# Altium footprint library IntegratedPcbLib.PcbLib: 81 footprints (part 3 of 6)
Each footprint in its own frame and in the unit in brackets; x right, y up, seen from the top. Pads: shape width x height; smd on the part's side, far side on the other; paste and mask are expansions set on the pad; w line width, h text height; cw(c..) or ccw(c..) is an arc to the next point about the centre after c.
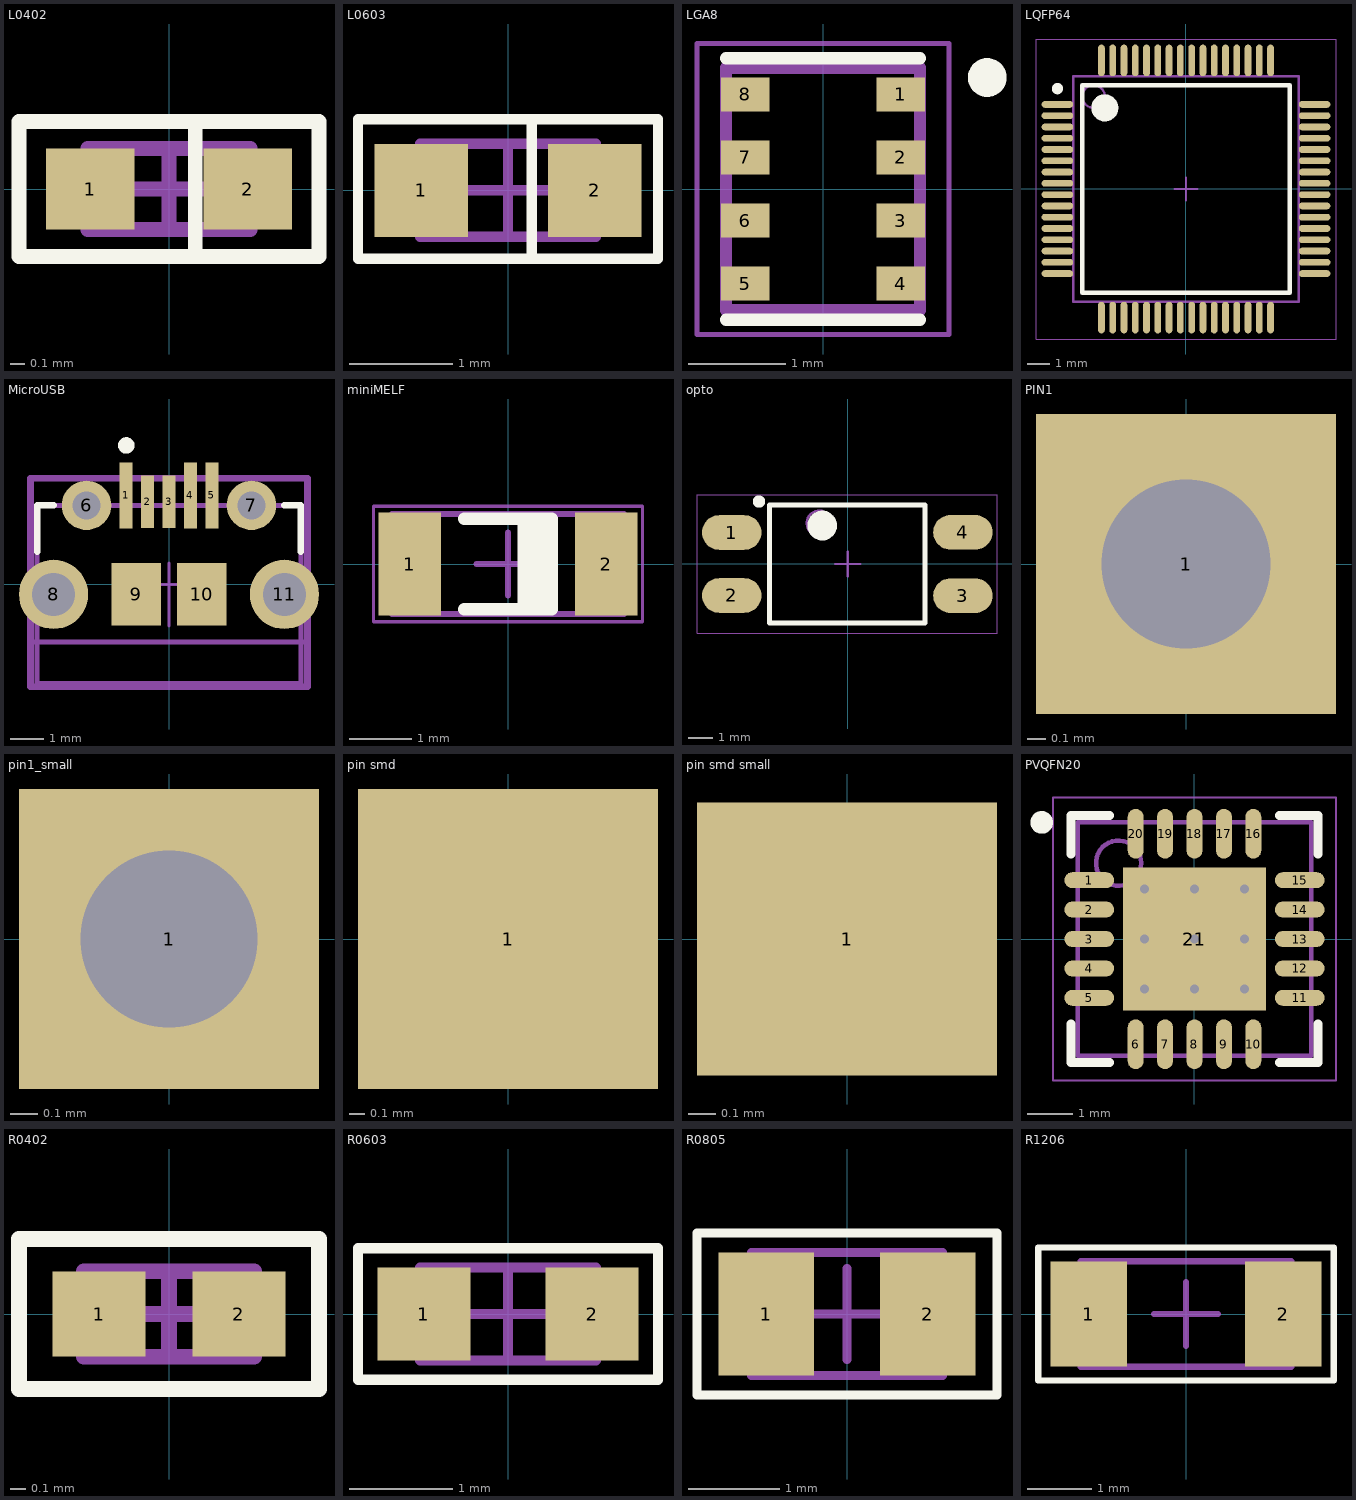
[diagram p2: the footprints below, top view; thin cyan lines are the x and y axes]

## L0402 [mm] "Chip LED, 2-Leads, Body 1,00x0,50mm, IPC Medium Density"
height 0.4
pads (2):
  rect 0.6x0.55 smd: 1(-0.533,0) 2(0.533,0)
Top Overlay:
  lines w0.1: 0.178,-0.432 0.178,0.432 ; -1.016,-0.457 -1.016,0.457 1.016,0.457 1.016,-0.457 -1.016,-0.457
Mechanical 13:
  lines w0.1: -0.55,-0.275 -0.55,0.275 0.55,0.275 0.55,-0.275 -0.55,-0.275
Mechanical 15:
  lines w0.1: -0.275,0 0.275,0 ; 0,-0.275 0,0.275
3D body "User Library-LED SMD0603.step": height 0.68, standoff 0, extent -0.825,-0.35 0.825,0.375

## L0603 [mm] "Chip LED, 2-Leads, Body 1,60x0,80mm, IPC Medium Density"
height 0.5
pads (2):
  rect 0.9x0.9 smd: 1(-0.838,0) 2(0.838,0)
Top Overlay:
  lines w0.1: 0.229,-0.635 0.229,0.635 ; -1.45,-0.66 1.45,-0.66 1.45,0.686 -1.45,0.686 -1.45,-0.66
Mechanical 13:
  lines w0.1: -0.85,-0.45 0.85,-0.45 0.85,0.45 -0.85,0.45 -0.85,-0.45
Mechanical 15:
  lines w0.1: -0.45,0 0.45,0 ; 0,-0.45 0,0.45
3D body "User Library-LED SMD0603.step": height 0.68, standoff 0, extent -0.825,-0.35 0.825,0.375

## LGA8 [mm]
pads (8):
  rect 0.5x0.35 smd: 1(0.8,0.975) 2(0.8,0.325) 3(0.8,-0.325) 4(0.8,-0.975) 5(-0.8,-0.975) 6(-0.8,-0.325) 7(-0.8,0.325) 8(-0.8,0.975)
Top Overlay:
  circle w0.2: c1.695,1.15 r0.1
  lines w0.127: -1,-1.35 1,-1.35 ; -1,1.35 1,1.35
Mechanical 4:
  lines w0.127: -1,-1.25 1,-1.25 ; -1,-1.25 -1,1.25 ; -1,-1.25 1,-1.25 ; -1,-1.25 -1,1.25 ; -1,1.25 1,1.25 ; -1,1.25 1,1.25 ; 1,-1.25 1,1.25 ; 1,-1.25 1,1.25
Mechanical 16:
  lines w0.05: -1.3,-1.5 -1.3,1.5 1.3,1.5 1.3,-1.5 -1.3,-1.5
3D body "User Library-BST-BMP280.step": height 1, standoff 0, extent -1,-1.25 1,1.25

## LQFP64 [mm] "LQFP, 64-Leads, Body 10,00x10,00mm, Pitch 0,50mm, IPC Medium Density"
height 1.6
pads (64):
  oval 1.4x0.3 smd: 1(-5.7,3.75) 2(-5.7,3.25) 3(-5.7,2.75) 4(-5.7,2.25) 5(-5.7,1.75) 6(-5.7,1.25) 7(-5.7,0.75) 8(-5.7,0.25) 9(-5.7,-0.25) 10(-5.7,-0.75) 11(-5.7,-1.25) 12(-5.7,-1.75) 13(-5.7,-2.25) 14(-5.7,-2.75) 15(-5.7,-3.25) 16(-5.7,-3.75) 33(5.7,-3.75) 34(5.7,-3.25) 35(5.7,-2.75) 36(5.7,-2.25) 37(5.7,-1.75) 38(5.7,-1.25) 39(5.7,-0.75) 40(5.7,-0.25) 41(5.7,0.25) 42(5.7,0.75) 43(5.7,1.25) 44(5.7,1.75) 45(5.7,2.25) 46(5.7,2.75) 47(5.7,3.25) 48(5.7,3.75)
  oval 0.3x1.4 smd: 17(-3.75,-5.7) 18(-3.25,-5.7) 19(-2.75,-5.7) 20(-2.25,-5.7) 21(-1.75,-5.7) 22(-1.25,-5.7) 23(-0.75,-5.7) 24(-0.25,-5.7) 25(0.25,-5.7) 26(0.75,-5.7) 27(1.25,-5.7) 28(1.75,-5.7) 29(2.25,-5.7) 30(2.75,-5.7) 31(3.25,-5.7) 32(3.75,-5.7) 49(3.75,5.7) 50(3.25,5.7) 51(2.75,5.7) 52(2.25,5.7) 53(1.75,5.7) 54(1.25,5.7) 55(0.75,5.7) 56(0.25,5.7) 57(-0.25,5.7) 58(-0.75,5.7) 59(-1.25,5.7) 60(-1.75,5.7) 61(-2.25,5.7) 62(-2.75,5.7) 63(-3.25,5.7) 64(-3.75,5.7)
Top Overlay:
  circle w0.25: c-5.7,4.45 r0.125
  circle w0.6: c-3.6,3.6 r0.3
  lines w0.2: -4.6,-4.6 -4.6,4.6 4.6,4.6 4.6,-4.6 -4.6,-4.6
Mechanical 13:
  circle w0.1: c-4.1,4.1 r0.5
  lines w0.1: -5,-5 -5,5 5,5 5,-5 -5,-5
Mechanical 15:
  lines w0.05: -6.65,-6.65 -6.65,6.65 6.65,6.65 6.65,-6.65 -6.65,-6.65
  lines w0.1: -0.5,0 0.5,0 ; 0,-0.5 0,0.5
3D body "User Library-LQFP64_Grid_0_5.STEP": height 1.6, standoff 0, extent -5.994,-6.006 6.006,5.994

## MicroUSB [mm]
pads (11):
  rect 0.4x2 smd paste+0 mask+0: 1(-1.3,2.7) 4(0.65,2.7) 5(1.3,2.7)
  rect 0.4x1.6 smd paste+0 mask+0: 2(-0.65,2.51) 3(0,2.51)
  round 1.5 hole 0.85 paste-1000 mask+0: 6(-2.5,2.4) 7(2.5,2.4)
  round 2.1 hole 1.3 paste-1000 mask+0: 8(-3.5,-0.3) 11(3.5,-0.3)
  rect 1.5x1.9 smd paste+0 mask+0: 9(-1,-0.3) 10(1,-0.3)
Top Overlay:
  circle w0.25: c-1.295,4.216 r0.125
  lines w0.2: -4,1 -4,2.4 -3.5,2.4 ; 3.5,2.4 4,2.4 4,1
Mechanical 10:
  lines w0.2: -4.2,-3.1 4.2,-3.1 4.2,3.225 -4.2,3.225 -4.2,-3.1
Mechanical 12:
  lines w0.15: -4.225,-1.75 4.225,-1.75 ; -4,-3 4,-3 4,2.4 -4,2.4 -4,-3
Mechanical 15:
  lines w0.1: -0.949,0 0.949,0 ; 0,-1.249 0,0.649
  lines w0.2: -4.2,-3.1 4.2,-3.1 4.2,3.225 -4.2,3.225 -4.2,-3.1
3D body "User Library-MicroUSB-B_Molex_105017-0001.step": height 2.68, standoff -0.63, extent -4.1,-2.805 4.1,2.625

## miniMELF [mm] "MELF Diode, 2-Leads, Body 3,50x1,50mm, IPC High Density"
height 1.6
pads (2):
  rect 1x1.65 smd: 1(-1.575,0) 2(1.575,0)
Top Overlay:
  rectangle: 0.15,-0.725 0.7,0.725
  lines w0.2: -0.7,-0.725 0.7,-0.725 0.7,0.725 -0.7,0.725
Mechanical 13:
  lines w0.1: -1.85,-0.8 1.85,-0.8 1.85,0.8 -1.85,0.8 -1.85,-0.8
Mechanical 15:
  lines w0.05: -2.15,-0.925 2.15,-0.925 2.15,0.925 -2.15,0.925 -2.15,-0.925
  lines w0.1: -0.5,0 0.5,0 ; 0,-0.5 0,0.5
3D body "User Library-MiniMelf-2.step": height 1.6, standoff 0, extent -1.82,-0.8 1.88,0.8

## opto [mm] "CFP, 4-Leads, Body 5,10x4,10mm (max), Pitch 2,54mm, IPC Medium Density"
height 4
pads (4):
  oval 2.4x1.4 smd: 1(-4.675,1.27) 2(-4.675,-1.27) 3(4.65,-1.275) 4(4.65,1.275)
Top Overlay:
  circle w0.6: c-1.025,1.55 r0.3
  circle w0.25: c-3.575,2.52 r0.125
  lines w0.2: -3.15,-2.375 -3.15,2.375 3.125,2.375 3.125,-2.375 -3.15,-2.375
Mechanical 13:
  circle w0.1: c-1.15,1.65 r0.5
  lines w0.1: -3.125,-2.4 -3.125,2.35 3.125,2.35 3.125,-2.4 -3.125,-2.4
Mechanical 15:
  lines w0.05: -6.075,-2.8 -6.075,2.8 6.025,2.8 6.025,-2.8 -6.075,-2.8
  lines w0.1: -0.5,0 0.5,0 ; 0,-0.5 0,0.5
3D body "User Library-4-SMD.step": height 3.81, standoff 0.05, extent -4.98,-2.3 5.18,2.297

## PIN1 [mm] "Connector; Plug"
pads (1):
  rect 1.6x1.6 hole 0.9: 1(0,0)

## pin1_small [mm]
pads (1):
  rect 1.1x1.1 hole 0.65: 1(0,0)

## pin smd [mm] "Chip Resistor, 2-Leads, Body 1,60x0,80mm, IPC Medium Density"
height 0.5
pads (1):
  rect 2x2 smd: 1(0,0)

## pin smd small [mm] "Chip Resistor, 2-Leads, Body 1,60x0,80mm, IPC Medium Density"
height 0.5
pads (1):
  rect 1.1x1 smd: 1(0,0)

## PVQFN20 [mm] "QFN, 20-Leads, Body 5,00x5,00mm, Pitch 0,65mm, Thermal Pad 3,15x3,15mm, IPC Medium Density"
height 1
pads (21):
  oval 1.1x0.35 smd: 1(-2.325,1.3) 2(-2.325,0.65) 3(-2.325,0) 4(-2.325,-0.65) 5(-2.325,-1.3) 11(2.325,-1.3) 12(2.325,-0.65) 13(2.325,0) 14(2.325,0.65) 15(2.325,1.3)
  oval 0.35x1.1 smd: 6(-1.3,-2.325) 7(-0.65,-2.325) 8(0,-2.325) 9(0.65,-2.325) 10(1.3,-2.325) 16(1.3,2.325) 17(0.65,2.325) 18(0,2.325) 19(-0.65,2.325) 20(-1.3,2.325)
  rect 3.15x3.15 smd: 21(0,0)
via -1.1,1.1 diameter 0.5 hole 0.2
via 0,1.1 diameter 0.5 hole 0.2
via 1.1,1.1 diameter 0.5 hole 0.2
via -1.1,0 diameter 0.5 hole 0.2
via 0,0 diameter 0.5 hole 0.2
via 1.1,0 diameter 0.5 hole 0.2
via -1.1,-1.1 diameter 0.5 hole 0.2
via 0,-1.1 diameter 0.5 hole 0.2
via 1.1,-1.1 diameter 0.5 hole 0.2
Top Overlay:
  circle w0.25: c-3.375,2.575 r0.125
  lines w0.2: -2.725,-1.875 -2.725,-2.725 -1.875,-2.725 ; -2.725,1.875 -2.725,2.725 -1.875,2.725 ; 1.875,-2.725 2.725,-2.725 2.725,-1.875 ; 1.875,2.725 2.725,2.725 2.725,1.875
Mechanical 13:
  circle w0.1: c-1.675,1.675 r0.5
  lines w0.1: -2.575,-2.575 -2.575,2.575 2.575,2.575 2.575,-2.575 -2.575,-2.575
Mechanical 15:
  lines w0.05: -3.125,-3.125 -3.125,3.125 3.125,3.125 3.125,-3.125 -3.125,-3.125
  lines w0.1: -0.5,0 0.5,0 ; 0,-0.5 0,0.5
3D body "User Library-PVQFN-20.SLDPRT": height 0.92, standoff 0.02, extent -2.5,-2.5 2.5,2.5

## R0402 [mm] "Chip Resistor, 2-Leads, Body 1,00x0,50mm, IPC Medium Density"
height 0.4
pads (2):
  rect 0.6x0.55 smd: 1(-0.45,0) 2(0.45,0)
Top Overlay:
  lines w0.1: -0.965,-0.483 -0.965,0.483 0.965,0.483 0.965,-0.483 -0.965,-0.483
Mechanical 13:
  lines w0.1: -0.55,-0.275 -0.55,0.275 0.55,0.275 0.55,-0.275 -0.55,-0.275
Mechanical 15:
  lines w0.1: -0.275,0 0.275,0 ; 0,-0.275 0,0.275
3D body "User Library-0402R.step": height 0.34, standoff 0, extent -0.52,-0.3 0.52,0.3

## R0603 [mm] "Chip Resistor, 2-Leads, Body 1,60x0,80mm, IPC Medium Density"
height 0.5
pads (2):
  rect 0.9x0.9 smd: 1(-0.813,0) 2(0.813,0)
Top Overlay:
  lines w0.1: -1.45,-0.635 1.45,-0.635 1.45,0.635 -1.45,0.635 -1.45,-0.635
Mechanical 13:
  lines w0.1: -0.85,-0.45 -0.85,0.45 0.85,0.45 0.85,-0.45 -0.85,-0.45
Mechanical 15:
  lines w0.1: -0.45,0 0.45,0 ; 0,-0.45 0,0.45
3D body "User Library-R SMD 0603.STEP": height 0.49, standoff 0.04, extent -0.799,-0.372 0.841,0.478

## R0805 [mm] "Chip Resistor, 2-Leads, Body 2,00x1,25mm, IPC Medium Density"
height 0.6
pads (2):
  rect 1.05x1.35 smd: 1(-0.889,0) 2(0.889,0)
Top Overlay:
  lines w0.1: -1.65,-0.889 -1.65,0.889 1.65,0.889 1.65,-0.889 -1.65,-0.889
Mechanical 13:
  lines w0.1: -1.05,-0.675 -1.05,0.675 1.05,0.675 1.05,-0.675 -1.05,-0.675
Mechanical 15:
  lines w0.1: -0.5,0 0.5,0 ; 0,-0.5 0,0.5
3D body "User Library-RES_2013-0805.step": height 0.76, standoff 0, extent -1.15,-0.675 1.15,0.675

## R1206 [mm] "Chip Resistor, 2-Leads, Body 3,15x1,55mm, IPC Medium Density"
height 1
pads (2):
  rect 1.2x1.65 smd: 1(-1.524,0) 2(1.524,0)
Top Overlay:
  lines w0.1: -2.311,-1.041 -2.311,1.041 2.311,1.041 2.311,-1.041 -2.311,-1.041
Mechanical 13:
  lines w0.1: -1.65,-0.825 1.65,-0.825 1.65,0.825 -1.65,0.825 -1.65,-0.825
Mechanical 15:
  lines w0.1: -0.5,0 0.5,0 ; 0,-0.5 0,0.5
3D body "User Library-RES_3216-1206.step": height 0.85, standoff 0, extent -1.675,-0.865 1.675,0.865